# Altium footprint library user_ESP.PcbLib: 2 footprints
Each footprint in its own frame and in the unit in brackets; x right, y up, seen from the top. Pads: shape width x height; smd on the part's side, far side on the other; paste and mask are expansions set on the pad; w line width, h text height; cw(c..) or ccw(c..) is an arc to the next point about the centre after c.
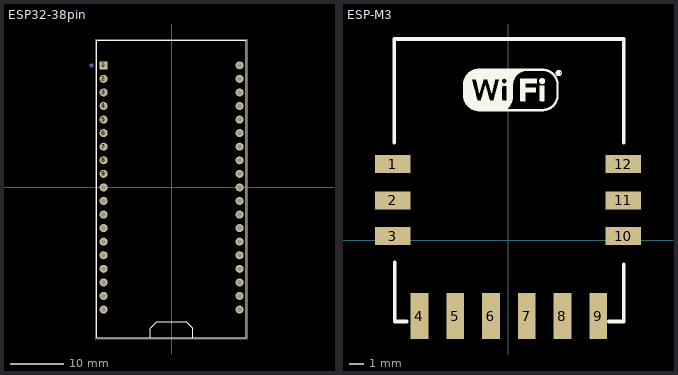
[diagram p0: the footprints below, top view; thin cyan lines are the x and y axes]

## ESP32-38pin [mm]
pads (38):
  rect 1.5x1.5 hole 0.9: 1(-12.725,22.86)
  round 1.5 hole 0.9: 2(-12.725,20.32) 3(-12.725,17.78) 4(-12.725,15.24) 5(-12.725,12.7) 6(-12.725,10.16) 7(-12.725,7.62) 8(-12.725,5.08) 9(-12.725,2.54) 10(-12.725,0) 11(-12.725,-2.54) 12(-12.725,-5.08) 13(-12.725,-7.62) 14(-12.725,-10.16) 15(-12.725,-12.7) 16(-12.725,-15.24) 17(-12.725,-17.78) 18(-12.725,-20.32) 19(-12.725,-22.86) 20(12.725,-22.86) 21(12.725,-20.32) 22(12.725,-17.78) 23(12.725,-15.24) 24(12.725,-12.7) 25(12.725,-10.16) 26(12.725,-7.62) 27(12.725,-5.08) 28(12.725,-2.54) 29(12.725,0) 30(12.725,2.54) 31(12.725,5.08) 32(12.725,7.62) 33(12.725,10.16) 34(12.725,12.7) 35(12.725,15.24) 36(12.725,17.78) 37(12.725,20.32) 38(12.725,22.86)
Top Overlay:
  lines w0.127: -13.978,-28.125 -13.978,27.545 ; -13.978,27.555 13.932,27.555 13.962,27.525 13.962,-28.125 ; -13.958,-28.125 13.942,-28.125 ; -4.008,-28.145 -4.008,-26.395 -2.758,-25.145 2.742,-25.145 3.992,-26.395 3.992,-28.145
Mechanical 13:
  circle w0.48: c-15.008,22.855 r0.14
Mechanical 15:
  lines w0.05: -14.228,-28.375 -14.228,27.775 14.172,27.775 ; -14.208,-28.375 14.192,-28.375 14.192,27.775
3D body "ESP32 Development Board.STEP": height 7.01, standoff -6.13, extent -14.097,-28.257 13.843,27.323

## ESP-M3 [mil]
pads (12):
  rect 100x50 smd: 1(-322.64,212.5) 2(-322.36,111.36) 3(-322.36,11.36) 10(322.64,11.36) 11(322.64,111.36) 12(322.36,212.5)
  rect 50x127.95 smd: 4(-247.64,-212.5) 5(-147.64,-212.5) 6(-47.64,-212.5) 7(52.36,-212.5) 8(152.36,-212.5) 9(252.36,-212.5)
Top Overlay:
  drawing of 1267 lines, arcs and shapes, not listed
Mechanical 13:
  text "CUTOUT POLYGON" at -289.6,508.09 h10
  text "ANTENNA AREA" at -289.6,528.09 h10
  text ".Designator" at -87.64,187.5 h39.37
3D body "ESP-M3.stp": height 114.24, standoff -0.39, extent -312.99,-224.98 317.72,562.82